# Altium footprint library ADP_Connector.PcbLib: 49 footprints (part 3 of 4)
Each footprint in its own frame and in the unit in brackets; x right, y up, seen from the top. Pads: shape width x height; smd on the part's side, far side on the other; paste and mask are expansions set on the pad; w line width, h text height; cw(c..) or ccw(c..) is an arc to the next point about the centre after c.
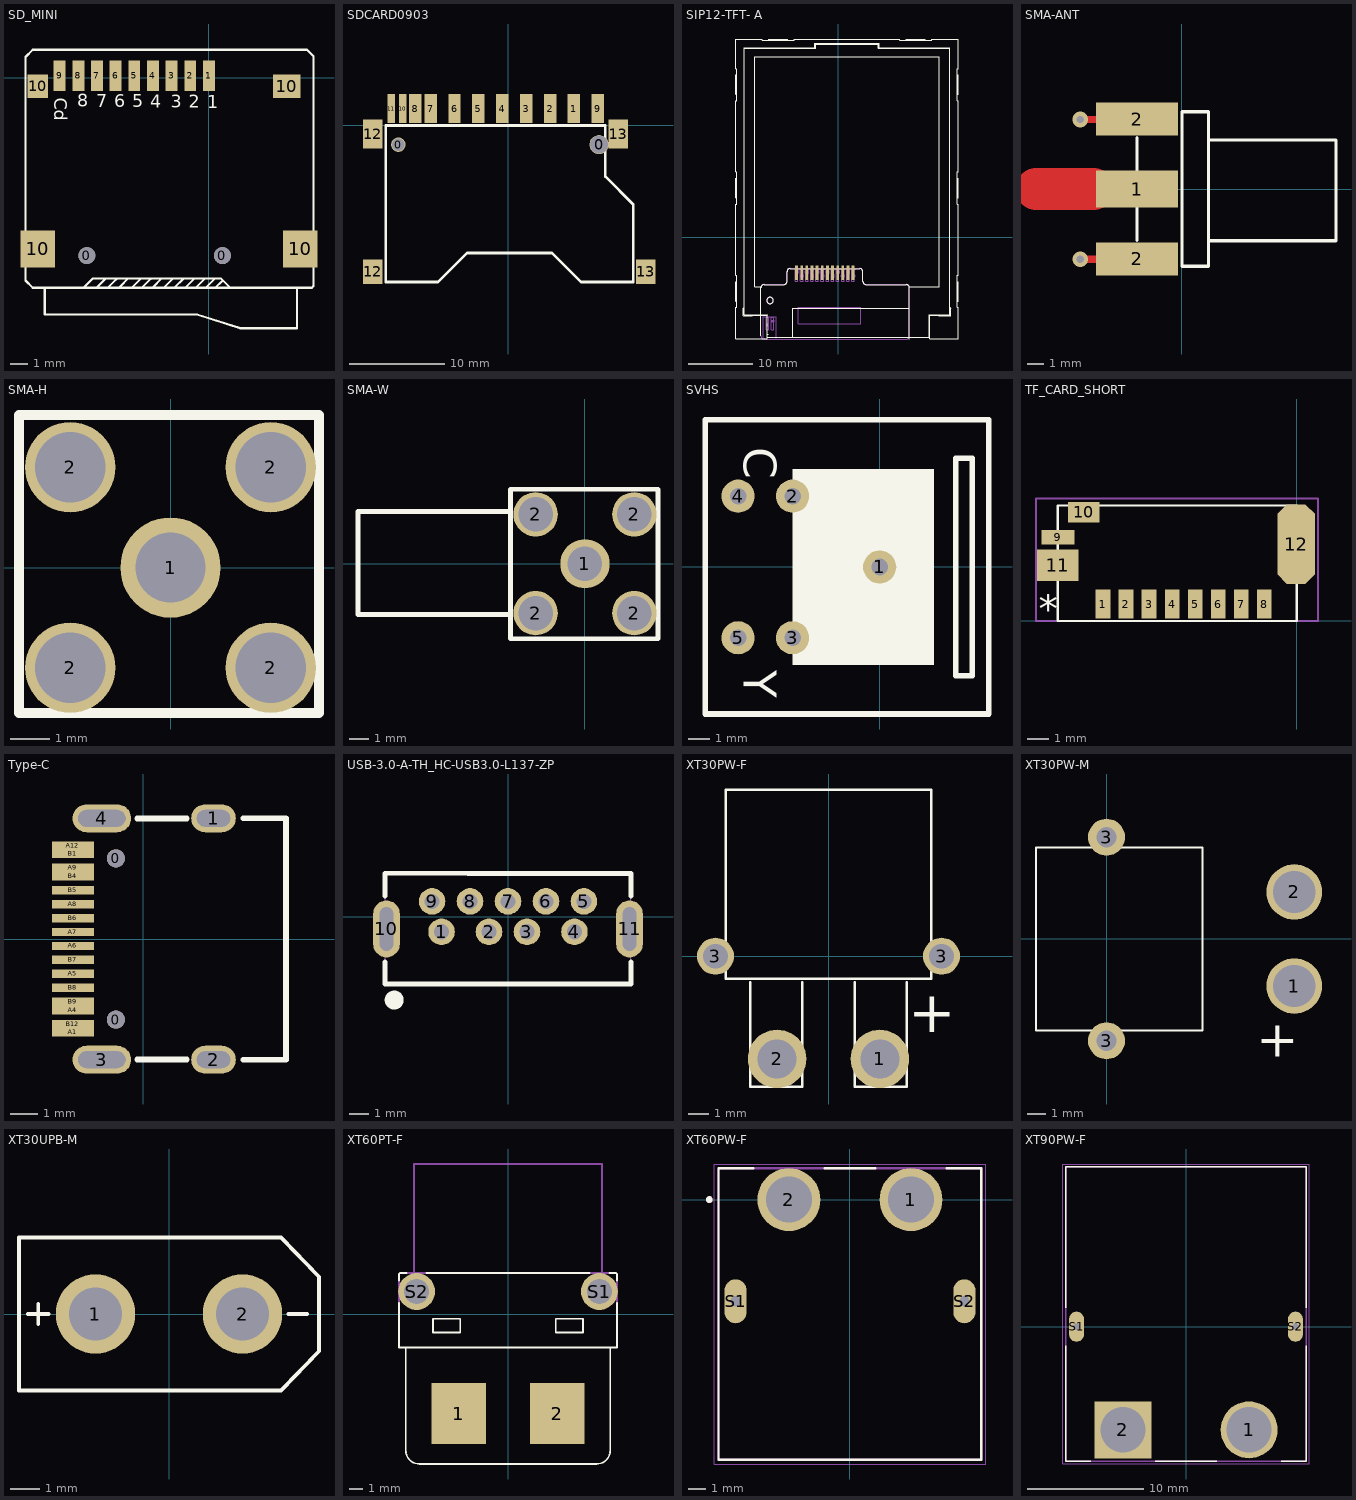
[diagram p2: the footprints below, top view; thin cyan lines are the x and y axes]

## SD_MINI [mm]
pads (15):
  round 1 hole 1 unplated: 0(-7.2,-10.5) 0(0.8,-10.5)
  rect 0.7x1.8 smd: 1(0,0.127) 2(-1.1,0.127) 3(-2.2,0.127) 4(-3.3,0.127) 5(-4.4,0.127) 6(-5.5,0.127) 7(-6.6,0.127) 8(-7.7,0.127) 9(-8.8,0.127)
  rect 2.032x2.2 smd: 10(-10.1,-10.1) 10(5.4,-10.1)
  rect 1.2x1.4 smd: 10(-10.1,-0.5)
  rect 1.6x1.4 smd: 10(4.6,-0.5)
Top Overlay:
  lines w0.127: -9.677,-12.395 -9.677,-13.97 -0.686,-13.97 ; -6.629,-12.395 -6.096,-11.862 -6.096,-11.836 ; -5.969,-12.395 -5.461,-11.887 -5.461,-11.836 ; -5.232,-12.395 -5.232,-12.319 -4.75,-11.836 ; -4.547,-12.395 -3.988,-11.836 -3.962,-11.836 ; -3.962,-12.395 -3.429,-11.862 -3.429,-11.836 ; -3.327,-12.395 -2.769,-11.836 -2.667,-11.836 ; -2.667,-12.395 -2.108,-11.836 -2.083,-11.836 ; -2.032,-12.395 -1.499,-11.862 -1.499,-11.836 ; -1.397,-12.395 -0.838,-11.836 -0.711,-11.836 ; -0.762,-12.395 -0.203,-11.836 -0.178,-11.836 ; -0.711,-13.97 1.854,-14.783 5.207,-14.783 5.207,-12.421 ; -0.178,-12.395 0.381,-11.836 ; 0.381,-12.395 0.787,-11.989 0.864,-11.989 ; -10.389,-12.395 -10.82,-11.963 -10.82,1.219 -10.389,1.651 5.791,1.651 6.172,1.27 6.172,-12.294 6.071,-12.395 ; -10.389,-12.395 6.071,-12.395 ; -10.389,-12.395 -7.391,-12.395 -6.833,-11.836 0.711,-11.836 1.27,-12.395 6.071,-12.395
  text "Cd" at -9.119,-1.168 h0.76
  text "8" at -7.772,-1.727 h0.76
  text "7" at -6.655,-1.753 h0.76
  text "6" at -5.588,-1.753 h0.76
  text "5" at -4.521,-1.753 h0.76
  text "4" at -3.454,-1.778 h0.76
  text "3" at -2.261,-1.778 h0.76
  text "2" at -1.194,-1.778 h0.76
  text "1" at -0.102,-1.803 h0.76
3D body "sdcard.STEP": height 1.8, standoff -0.7, extent -10.372,-14.725 5.901,0.469

## SDCARD0903 [mm] "SD卡插座0903"
pads (17):
  round 1.524 hole 1.321: 0(-11.5,-2)
  round 2 hole 1.9: 0(9.5,-2)
  rect 1.3x3 smd: 1(6.875,1.778) 2(4.375,1.778) 3(1.875,1.778) 4(-0.625,1.778) 5(-3.125,1.778) 6(-5.625,1.778) 7(-8.125,1.778) 8(-9.75,1.778) 9(9.375,1.778)
  rect 0.762x3 smd: 10(-11.05,1.778) 11(-12.25,1.778)
  rect 2.032x2.54 smd: 12(-14.2,-15.3) 13(14.4,-15.3)
  rect 2.032x3.048 smd: 12(-14.2,-0.9) 13(11.5,-0.9)
Top Overlay:
  lines w0.279: -12.827,-16.383 -12.827,0 10.16,0 10.16,-5.334 13.081,-8.255 13.081,-16.383 7.62,-16.383 4.572,-13.335 0,-13.335 -4.318,-13.335 -7.366,-16.383 -12.827,-16.383
3D body "SD Kart.step": height 3, standoff -1, extent -14.224,-28.564 14.376,1.436

## SIP12-TFT- A [mm]
pads (12):
  rect 0.43x2.3 smd: 1(2.305,-5.523) 2(1.505,-5.523) 3(0.705,-5.523) 4(-0.095,-5.523) 5(-0.895,-5.523) 6(-1.695,-5.523) 7(-2.495,-5.523) 8(-3.295,-5.523) 9(-4.095,-5.523) 10(-4.895,-5.523) 11(-5.695,-5.523) 12(-6.495,-5.523)
Top Overlay:
  circle w0.127: c-10.635,-9.83 r0.5
  lines w0.127: -15.793,-9.916 -15.993,-9.916 ; -15.793,-6.916 -15.993,-6.916 ; -15.793,6.184 -15.993,6.184 ; -15.793,9.184 -15.993,9.184 ; -15.793,22.284 -15.993,22.284 ; -15.793,25.284 -15.993,25.284 ; -14.243,-12.202 -14.243,-12.052 ; -12.036,-15.354 -12.036,-7.854 cw(c-11.536,-7.854) -11.536,-7.354 -8.476,-7.354 ccw(c-8.476,-6.854) -7.976,-6.854 -7.976,-5.354 cw(c-7.476,-5.354) -7.476,-4.854 3.324,-4.854 cw(c3.324,-5.354) 3.824,-5.354 3.824,-6.854 ccw(c4.324,-6.854) 4.324,-7.354 10.574,-7.354 cw(c10.574,-7.854) 11.074,-7.854 11.074,-15.516 ; -12.036,-7.696 -13.009,-7.696 -13.009,28.144 15.723,28.144 15.723,-7.696 11.074,-7.696 ; -11.043,-15.566 14.257,-15.566 ; -10.943,-15.516 14.157,-15.516 14.157,-12.052 17.323,-12.052 17.323,29.468 6.257,29.468 6.257,30.084 -3.543,30.084 -3.543,29.468 -14.609,29.468 -14.609,-12.052 -10.943,-12.052 ; -10.943,-15.066 -11.043,-15.066 -10.893,-15.066 ; -10.84,30.684 -10.84,30.884 ; -8.643,-15.566 -8.643,-15.516 ; -7.84,30.684 -7.84,30.884 ; -7.083,-15.494 -7.083,-11.002 11.057,-11.002 11.057,-15.824 ; 10.555,30.684 10.555,30.884 ; 11.857,-15.566 11.857,-15.516 ; 13.555,30.684 13.555,30.884 ; 14.107,-15.066 14.257,-15.066 14.157,-15.066 ; 17.157,-12.202 17.157,-12.052 ; 17.373,-4.466 17.373,22.214 ; 18.507,-9.916 18.707,-9.916 ; 18.507,-6.916 18.707,-6.916 ; 18.507,6.184 18.707,6.184 ; 18.507,9.184 18.707,9.184 ; 18.507,22.284 18.707,22.284 ; 18.507,25.284 18.707,25.284 ; -15.993,-9.916 -15.993,-6.916 ; -15.993,-9.916 -15.993,-6.916 ; -15.993,6.184 -15.993,9.184 ; -15.993,6.184 -15.993,9.184 ; -15.993,22.284 -15.993,25.284 ; -15.993,22.284 -15.993,25.284 ; -10.84,30.884 -7.84,30.884 ; -10.84,30.884 -7.84,30.884 ; 10.555,30.884 13.555,30.884 ; 10.555,30.884 13.555,30.884 ; 18.707,-9.916 18.707,-6.916 ; 18.707,-9.916 18.707,-6.916 ; 18.707,6.184 18.707,9.184 ; 18.707,6.184 18.707,9.184 ; 18.707,22.284 18.707,25.284 ; 18.707,22.284 18.707,25.284 ; -15.993,-15.816 -15.993,-10.916 -15.793,-10.916 -15.793,-5.916 -15.993,-5.916 -15.993,5.184 -15.793,5.184 -15.793,10.184 -15.993,10.184 -15.993,21.284 -15.793,21.284 -15.793,26.284 -15.993,26.284 -15.993,30.884 -11.84,30.884 -11.84,30.684 -6.84,30.684 -6.84,30.884 9.555,30.884 9.555,30.684 14.555,30.684 14.555,30.884 18.707,30.884 18.707,26.284 18.507,26.284 18.507,21.284 18.707,21.284 18.707,10.184 18.507,10.184 18.507,5.184 18.707,5.184 18.707,-5.916 18.507,-5.916 18.507,-10.916 18.707,-10.916 18.707,-15.816 14.257,-15.816 14.257,-12.102 15.527,-12.102 15.657,-12.202 17.473,-12.202 17.473,-11.062 17.373,-10.898 17.373,29.518 6.357,29.518 6.357,30.184 -3.643,30.184 -3.643,29.518 -14.659,29.518 -14.659,-10.898 -14.759,-11.062 -14.759,-12.202 -13.366,-12.202 -13.259,-12.102 -11.043,-12.102 -11.043,-15.816 -15.993,-15.816
Mechanical 3:
  drawing of 186 lines, arcs and shapes, not listed
  text "A" at -10.395,-14.839 h0.41
  text "K" at -11.202,-14.855 h0.41
3D body "LCD.STEP": height 2.2, standoff 0, extent -15.9,-15.68 18.6,30.92

## SMA-ANT [mil] "142-0701-801/806"
pads (3):
  rect 200x90 smd: 1(-109,0)
  rect 200x80 all layers, no hole: 2(-109,-170) 2(-109,170)
via -247,-171 diameter 38 hole 18
via -247,169 diameter 38 hole 18
Top Layer:
  lines w18: -248,169 -128,169 ; -247,-171 -99,-171
  lines w103: -355,0 -216,0
Top Overlay:
  lines w7.87: -109,-125 -109,125 ; 68,-126 375,-126 375,119 68,119 ; 0,-188 0,188 65,188 65,-188 0,-188
3D body "SMA - 50 Ohm Connectors 142-0701-801.step": height 175.51, standoff -136.3, extent -190.91,-186 370.9,188.8

## SMA-H [mil]
pads (5):
  round 100 hole 70: 1(0,0)
  round 90 hole 70: 2(-100,-100) 2(-100,100) 2(100,-100) 2(100,100)
Top Overlay:
  lines w10: -151,-145 148,-145 148,152 -151,152 -151,-145
3D body "SMA-H.stp": height 105.71, standoff -430.31, extent -124.21,-124.2 124.21,124.22

## SMA-W [mil]
pads (5):
  round 100 hole 70: 1(0,0)
  round 90 hole 70: 2(-100,-100) 2(-100,100) 2(100,-100) 2(100,100)
Top Overlay:
  lines w10: -152,-103 -460,-103 -460,106 -151,106 ; -151,-152 -151,151 148,151 148,-152 -151,-152
3D body "Samtec-SMA-J-P-H-RA-TH1.step": height 108.06, standoff -447.24, extent -459.69,-139.8 134.8,135.79

## SVHS [mil] "S VIDEO PORT"
pads (5):
  round 60 hole 30: 1(0,0) 2(-157.48,127.95) 3(-157.48,-127.95) 4(-255.91,127.95) 5(-255.91,-127.95)
Top Overlay:
  rectangle: -157.48,-177.17 98.43,177.17
  lines w10: -314.96,-265.75 -314.96,265.75 196.85,265.75 196.85,-265.75 -314.96,-265.75 ; 137.8,-196.85 167.32,-196.85 167.32,196.85 137.8,196.85 137.8,-196.85
  text "Y" at -246.06,-187.01 h60
  text "C" at -246.06,216.54 h60
3D body "SVHS.STEP": height 767.72, standoff -59.06, extent -314.96,-255.9 118.11,255.91

## TF_CARD_SHORT [mm]
height 1
pads (12):
  rect 0.7x1.4 smd: 1(-9.25,0.8) 2(-8.15,0.8) 3(-7.05,0.8) 4(-5.95,0.8) 5(-4.85,0.8) 6(-3.75,0.8) 7(-2.65,0.8) 8(-1.55,0.8)
  rect 1.58x0.7 smd: 9(-11.399,3.991)
  rect 1.5x1 smd: 10(-10.16,5.182)
  rect 2x1.5 smd: 11(-11.41,2.66)
  oct 1.8x3.8 smd: 12(-0.025,3.658)
Top Overlay:
  lines w0.1: -11.41,0 -11.41,5.5 0,5.5 0,0 -11.41,0
  text "*" at -12.319,-0.508 h2.29
Mechanical 15:
  lines w0.1: -12.446,0 -12.446,5.842 1.016,5.842 1.016,0 -12.446,0

## Type-C [mm]
pads (22):
  round 0.65 hole 0.65: 0(-0.98,-2.89) 0(-0.98,2.89)
  oval 1.6x1 hole 0.6 slot 1.2 at 0 deg: 1(2.52,4.325) 2(2.52,-4.325)
  oval 2.1x1 hole 0.6 slot 1.7 at 0 deg: 3(-1.48,-4.325) 4(-1.48,4.325)
  rect 1.5x0.3 smd: A1(-2.52,-3.35) A4(-2.52,-2.55) A5(-2.52,-1.25) A6(-2.52,-0.25) A7(-2.52,0.25) A8(-2.52,1.25) A9(-2.52,2.55) A12(-2.52,3.35) B1(-2.52,3.05) B4(-2.52,2.25) B5(-2.52,1.75) B6(-2.52,0.75) B7(-2.52,-0.75) B8(-2.52,-1.75) B9(-2.52,-2.25) B12(-2.52,-3.05)
Top Overlay:
  lines w0.203: -0.218,-4.318 1.56,-4.318 ; -0.218,4.318 1.56,4.318 ; 3.592,-4.325 5.12,-4.325 5.12,4.325 3.592,4.325
3D body "TypeC-SMD16P.STEP": height 3.36, standoff -0.9, extent -2.542,-4.458 5.209,4.492

## USB-3.0-A-TH_HC-USB3.0-L137-ZP [mm]
pads (11):
  round 1.4 hole 0.8: 1(-3.5,-0.8) 2(-1,-0.8) 3(1,-0.8) 4(3.5,-0.8) 5(4,0.8) 6(2,0.8) 7(0,0.8) 8(-2,0.8) 9(-4,0.8)
  oval 1.4x3 hole 0.7 slot 2.3 at 90 deg: 10(-6.4,-0.65) 11(6.4,-0.65)
Top Overlay:
  circle w0.5: c-5.994,-4.394 r0.25
  lines w0.254: -6.477,-2.378 -6.477,-3.556 6.477,-3.556 6.477,-2.378 ; -6.477,1.078 -6.477,2.286 -2.109,2.271 -0.458,2.271 6.477,2.271 6.477,1.078
Mechanical 15:
  region: 6.27,0.15 6.47,0.15 6.47,-1.45 6.27,-1.45
  region: -6.47,0.15 -6.27,0.15 -6.27,-1.45 -6.47,-1.45
  region: 3.3,-0.7 3.7,-0.7 3.7,-0.9 3.3,-0.9
  region: 0.8,-0.7 1.2,-0.7 1.2,-0.9 0.8,-0.9
  region: -1.2,-0.7 -0.8,-0.7 -0.8,-0.9 -1.2,-0.9
  region: -3.7,-0.7 -3.3,-0.7 -3.3,-0.9 -3.7,-0.9
  region: 3.8,0.9 4.2,0.9 4.2,0.7 3.8,0.7
  region: 1.8,0.9 2.2,0.9 2.2,0.7 1.8,0.7
  region: -0.2,0.9 0.2,0.9 0.2,0.7 -0.2,0.7
  region: -2.2,0.9 -1.8,0.9 -1.8,0.7 -2.2,0.7
  region: -4.2,0.9 -3.8,0.9 -3.8,0.7 -4.2,0.7
  region: -6.417,-3.556 -6.417,-3.531 -6.452,-3.496 -6.502,-3.496 -6.537,-3.531 -6.537,-3.556 -6.537,-3.581 -6.502,-3.616 -6.452,-3.616 -6.417,-3.581 -6.417,-3.556
  lines w0.051: -6.477,-3.556 -6.477,2.286 6.462,2.286 6.477,2.271 6.477,-3.556 -6.477,-3.556

## XT30PW-F [mm]
pads (4):
  round 2.85 hole 1.9: 1(2.5,-5) 2(-2.5,-5)
  round 1.8 hole 1.2: 3(-5.5,0) 3(5.5,0)
Top Overlay:
  lines w0.127: -3.81,-1.27 -3.81,-5.08 -3.81,-6.35 -1.27,-6.35 -1.27,-1.27 ; 1.27,-1.27 1.27,-6.35 3.81,-6.35 3.81,-1.27 ; -5,-1.1 -5,8.1 5,8.1 5,-1.1 -5,-1.1
  text "+" at 6.2,-3.7 h2

## XT30PW-M [mm]
height 1.524
pads (4):
  round 3 hole 2.286 paste+0 mask+0.05: 1(10.14,-2.54) 2(10.14,2.54)
  round 2 hole 1.1 paste+0 mask+0.05: 3(0,-5.5) 3(0,5.5)
Top Overlay:
  lines w0.1: -3.81,-4.95 -3.81,0 -3.81,4.95 5.19,4.95 5.19,-4.95 -3.81,-4.95
  text "+" at 10.394,-6.35 h2
3D body "XT30PW-M.STEP": height 5.15, standoff -2.05, extent -3.052,-6.65 10.898,6.65

## XT30UPB-M [mm]
pads (2):
  round 2.7 hole 1.8: 1(-2.5,0) 2(2.5,0)
Top Overlay:
  lines w0.127: -4.8,0 -4.1,0 ; -4.445,-0.35 -4.445,0.35 ; 4.064,0 4.699,0 ; -5.1,-2.6 -5.1,2.6 3.81,2.6 5.1,1.27 5.1,-1.27 3.81,-2.6 -5.1,-2.6

## XT60PT-F [mm]
pads (4):
  rect 4x4.5 smd: 1(-3.6,-7.3) 2(3.6,-7.3)
  round 2.7 hole 1.8 slot 1.8 at 0 deg: S1(6.7,1.65) S2(-6.7,1.65)
Top Overlay:
  lines w0.127: -8,0.8 -8,-2.45 -7.5,-2.45 ; -8,2.45 -8,2.9 cw(c-7.9,2.9) -7.9,3 -7.45,3 ; -7.5,-10 ccw(c-6.5,-10) -6.5,-11 6.5,-11 ccw(c6.5,-10) 7.5,-10 ; -7.5,-10 -7.5,-2.45 ; -6,3 6,3 ; 7.45,3 7.9,3 cw(c7.9,2.9) 8,2.9 8,2.45 ; 7.5,-10 7.5,-2.45 ; 8,0.8 8,-2.45 7.5,-2.45 ; -7.5,-2.45 7.5,-2.45 ; -5.5,-1.35 -3.5,-1.35 -3.5,-0.35 -5.5,-0.35 -5.5,-1.35 ; 3.5,-1.35 5.5,-1.35 5.5,-0.35 3.5,-0.35 3.5,-1.35
Mechanical 15:
  lines w0.127: -8,0.8 -8,2.45 ; -7.45,3 -6,3 ; -6.9,3 -6.9,11 6.9,11 6.9,3 ; 6,3 7.45,3 ; 8,0.8 8,2.45

## XT60PW-F [mm]
height 8.4
pads (4):
  round 3.716 hole 2.7: 1(3.6,0) 2(-3.6,0)
  oval 1.3x2.6 hole 0.6 square: S1(-6.75,-6) S2(6.75,-6)
Top Overlay:
  circle w0.2: c-8.3,0 r0.1
  lines w0.127: -5.71,1.85 -7.75,1.85 -7.75,-15.35 7.75,-15.35 7.75,1.85 5.71,1.85 ; -1.49,1.85 1.49,1.85
Mechanical 13:
  circle w0.2: c-8.3,0 r0.1
  lines w0.127: -7.75,-15.35 -7.75,1.85 7.75,1.85 7.75,-15.35 -7.75,-15.35
Mechanical 15:
  lines w0.05: -8,-15.6 -8,2.1 8,2.1 8,-15.6 -8,-15.6
3D body "step_temp.STEP": height 8.4, standoff -2.55, extent -7.75,-15.35 7.75,1.85

## XT90PW-F [mm]
pads (4):
  round 4.916 hole 3.9: 1(5.45,-8.9)
  rect 4.916x4.916 hole 3.9: 2(-5.45,-8.9)
  oval 1.3x2.6 hole 0.6 square: S1(-9.45,0) S2(9.45,0)
Top Overlay:
  lines w0.127: -10.4,-1.62 -10.4,-11.6 -8.228,-11.6 ; -10.4,1.62 -10.4,13.8 10.4,13.8 10.4,1.62 ; -2.672,-11.6 2.672,-11.6 ; 8.228,-11.6 10.4,-11.6 10.4,-1.62
Mechanical 13:
  lines w0.127: -10.4,-11.6 -10.4,13.8 10.4,13.8 10.4,-11.6 -10.4,-11.6
Mechanical 15:
  lines w0.05: -10.65,-11.85 10.65,-11.85 10.65,14.05 -10.65,14.05 -10.65,-11.85
3D body "step_temp.STEP": height 10.3, standoff -3.2, extent -10.75,-11.6 10.75,13.8